# Altium footprint library Integrated_Circuit.PcbLib: 85 footprints (part 2 of 6)
Each footprint in its own frame and in the unit in brackets; x right, y up, seen from the top. Pads: shape width x height; smd on the part's side, far side on the other; paste and mask are expansions set on the pad; w line width, h text height; cw(c..) or ccw(c..) is an arc to the next point about the centre after c.
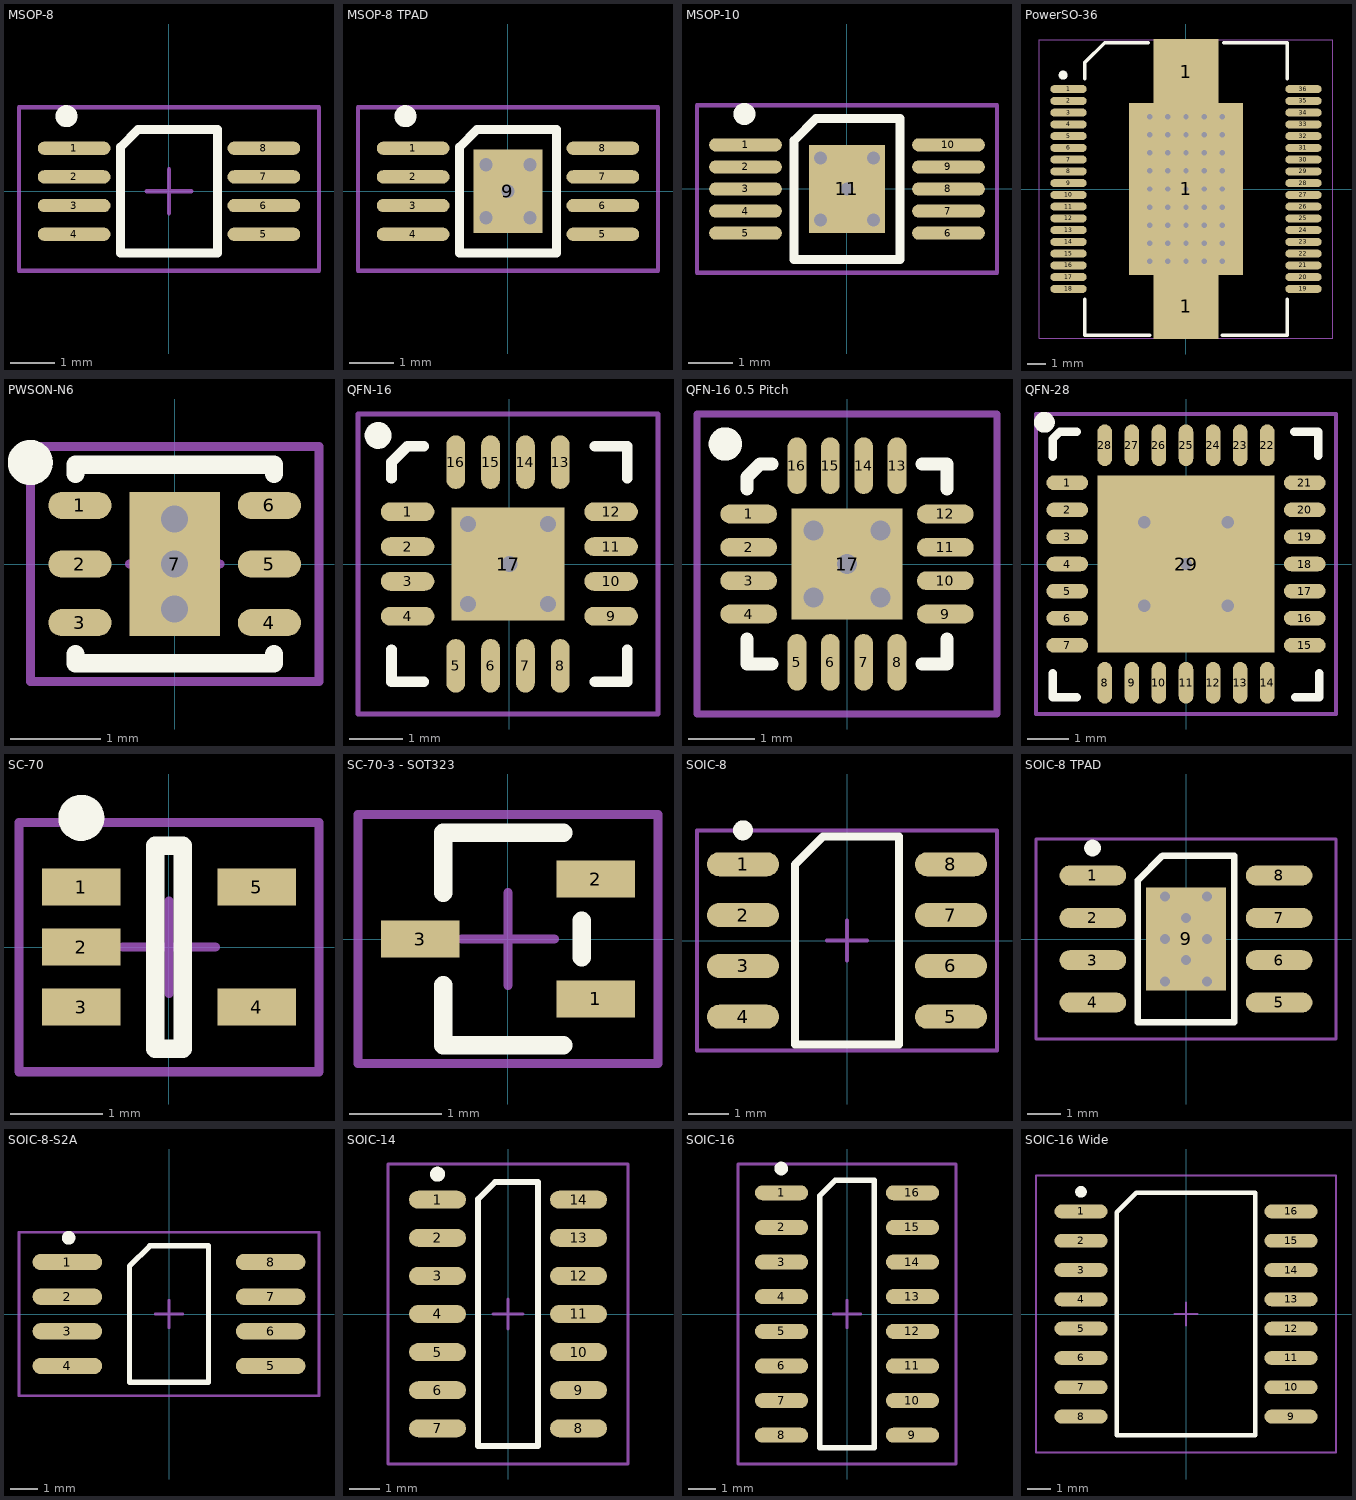
[diagram p1: the footprints below, top view; thin cyan lines are the x and y axes]

## MSOP-8 [mm] "without exposed pad"
height 1
pads (8):
  oval 1.65x0.3 smd: 1(-2.15,0.975) 2(-2.15,0.325) 3(-2.15,-0.325) 4(-2.15,-0.975) 5(2.15,-0.975) 6(2.15,-0.325) 7(2.15,0.325) 8(2.15,0.975)
Top Overlay:
  circle w0.25: c-2.325,1.7 r0.125
  lines w0.2: -1.1,-1.4 1.1,-1.4 1.1,1.4 -0.7,1.4 -1.1,1 -1.1,-1.4
Mechanical 15:
  lines w0.1: -0.5,0 0.5,0 ; 0,-0.5 0,0.5 ; -3.4,-1.8 -3.4,1.9 3.4,1.9 3.4,-1.8 -3.4,-1.8
3D body "User Library-MSOP-8-1.STEP": height 0.92, standoff 0, extent -2.5,-1.5 2.5,1.5

## MSOP-8 TPAD [mm] "with exposed pad"
height 1
pads (9):
  oval 1.65x0.3 smd: 1(-2.15,0.975) 2(-2.15,0.325) 3(-2.15,-0.325) 4(-2.15,-0.975) 5(2.15,-0.975) 6(2.15,-0.325) 7(2.15,0.325) 8(2.15,0.975)
  rect 1.57x1.89 smd: 9(0,0)
via 0,0 diameter 0.5 hole 0.3
via 0.5,0.6 diameter 0.5 hole 0.3
via -0.5,0.6 diameter 0.5 hole 0.3
via -0.5,-0.6 diameter 0.5 hole 0.3
via 0.5,-0.6 diameter 0.5 hole 0.3
Top Overlay:
  circle w0.25: c-2.325,1.7 r0.125
  lines w0.2: -1.1,-1.4 1.1,-1.4 1.1,1.4 -0.7,1.4 -1.1,1 -1.1,-1.4
Mechanical 15:
  lines w0.1: -0.5,0 0.5,0 ; 0,-0.5 0,0.5 ; -3.4,-1.8 -3.4,1.9 3.4,1.9 3.4,-1.8 -3.4,-1.8
3D body "User Library-MSOP-8-1.STEP": height 0.92, standoff 0, extent -2.5,-1.5 2.5,1.5

## MSOP-10 [mm]
height 1
pads (11):
  oval 1.65x0.3 smd: 1(-2.3,1) 2(-2.3,0.5) 3(-2.3,0) 4(-2.3,-0.5) 5(-2.3,-1) 6(2.3,-1) 7(2.3,-0.5) 8(2.3,0) 9(2.3,0.5) 10(2.3,1)
  rect 1.73x2 smd: 11(0,0)
via -0.6,0.7 diameter 0.5 hole 0.3
via -0.6,-0.7 diameter 0.5 hole 0.3
via 0.6,-0.7 diameter 0.5 hole 0.3
via 0.6,0.7 diameter 0.5 hole 0.3
via 0,0 diameter 0.5 hole 0.3
Top Overlay:
  circle w0.25: c-2.325,1.7 r0.125
  lines w0.2: -1.2,-1.6 1.2,-1.6 1.2,1.6 -0.7,1.6 -1.2,1.1 -1.2,-1.6
Mechanical 15:
  lines w0.1: -0.5,0 0.5,0 ; 0,-0.5 0,0.5 ; -3.4,-1.9 3.4,-1.9 3.4,1.9 -3.4,1.9 -3.4,-1.9
3D body "msop-10.STEP": height 1.15, standoff 0, extent -2.45,-1.5 2.45,1.5

## PowerSO-36 [mm]
pads (39):
  oval 2x0.45 smd: 1(-6.5,5.525) 2(-6.5,4.875) 3(-6.5,4.225) 4(-6.5,3.575) 5(-6.5,2.925) 6(-6.5,2.275) 7(-6.5,1.625) 8(-6.5,0.975) 9(-6.5,0.325) 10(-6.5,-0.325) 11(-6.5,-0.975) 12(-6.5,-1.625) 13(-6.5,-2.275) 14(-6.5,-2.925) 15(-6.5,-3.575) 16(-6.5,-4.225) 17(-6.5,-4.875) 18(-6.5,-5.525) 19(6.5,-5.525) 20(6.5,-4.875) 21(6.5,-4.225) 22(6.5,-3.575) 23(6.5,-2.925) 24(6.5,-2.275) 25(6.5,-1.625) 26(6.5,-0.975) 27(6.5,-0.325) 28(6.5,0.325) 29(6.5,0.975) 30(6.5,1.625) 31(6.5,2.275) 32(6.5,2.925) 33(6.5,3.575) 34(6.5,4.225) 35(6.5,4.875) 36(6.5,5.525)
  rect 3.6x3.6 smd: 1(0,-6.5) 1(0,6.5)
  rect 6.3x9.5 smd: 1(0,0)
via 0,0 diameter 0.5 hole 0.3
via 1,0 diameter 0.5 hole 0.3
via 2,0 diameter 0.5 hole 0.3
via -1,0 diameter 0.5 hole 0.3
via -2,0 diameter 0.5 hole 0.3
via -2,-1 diameter 0.5 hole 0.3
via -1,-1 diameter 0.5 hole 0.3
via 2,-1 diameter 0.5 hole 0.3
via 1,-1 diameter 0.5 hole 0.3
via 0,-1 diameter 0.5 hole 0.3
via -2,-2 diameter 0.5 hole 0.3
via -1,-2 diameter 0.5 hole 0.3
via 2,-2 diameter 0.5 hole 0.3
via 1,-2 diameter 0.5 hole 0.3
via 0,-2 diameter 0.5 hole 0.3
via -2,-3 diameter 0.5 hole 0.3
via -1,-3 diameter 0.5 hole 0.3
via 2,-3 diameter 0.5 hole 0.3
via 1,-3 diameter 0.5 hole 0.3
via 0,-3 diameter 0.5 hole 0.3
via -2,1 diameter 0.5 hole 0.3
via -1,1 diameter 0.5 hole 0.3
via 2,1 diameter 0.5 hole 0.3
via 1,1 diameter 0.5 hole 0.3
via 0,1 diameter 0.5 hole 0.3
via -2,2 diameter 0.5 hole 0.3
via -1,2 diameter 0.5 hole 0.3
via 2,2 diameter 0.5 hole 0.3
via 1,2 diameter 0.5 hole 0.3
via 0,2 diameter 0.5 hole 0.3
via -2,3 diameter 0.5 hole 0.3
via -1,3 diameter 0.5 hole 0.3
via 2,3 diameter 0.5 hole 0.3
via 1,3 diameter 0.5 hole 0.3
via 0,3 diameter 0.5 hole 0.3
via -2,4 diameter 0.5 hole 0.3
via -1,4 diameter 0.5 hole 0.3
via 2,4 diameter 0.5 hole 0.3
via 1,4 diameter 0.5 hole 0.3
via 0,4 diameter 0.5 hole 0.3
via -2,-4 diameter 0.5 hole 0.3
via -1,-4 diameter 0.5 hole 0.3
via 2,-4 diameter 0.5 hole 0.3
via 1,-4 diameter 0.5 hole 0.3
via 0,-4 diameter 0.5 hole 0.3
Top Overlay:
  circle w0.25: c-6.8,6.3 r0.125
  lines w0.2: -5.6,-6.1 -5.6,-8.1 -2,-8.1 ; -5.6,6.1 -5.6,7 -4.5,8.1 -2.1,8.1 ; 2,-8.1 5.6,-8.1 5.6,-6.1 ; 2.1,8.1 5.6,8.1 5.6,6.1
Mechanical 15:
  lines w0.05: -8.125,-8.25 8.125,-8.25 8.125,8.25 -8.125,8.25 -8.125,-8.25
  lines w0.1: -0.5,0 0.5,0 ; 0,-0.5 0,0.5
3D body "User Library-PowerSO36.STEP": height 3.6, standoff 0, extent -7.028,-8 7.028,8

## PWSON-N6 [mm]
pads (7):
  oval 0.7x0.3 smd: 1(-1.05,0.65) 2(-1.05,0) 3(-1.05,-0.65) 4(1.05,-0.65) 5(1.05,0) 6(1.05,0.65)
  rect 1x1.6 smd: 7(0,0)
via 0,0 diameter 0.5 hole 0.3
via 0,0.5 diameter 0.5 hole 0.3
via 0,-0.5 diameter 0.5 hole 0.3
Top Overlay:
  circle w0.25: c-1.6,1.125 r0.125
  lines w0.2: -1.1,-1 -1.1,-1.1 1.1,-1.1 1.1,-1 ; -1.1,1 -1.1,1.1 1.1,1.1 1.1,1
Mechanical 15:
  lines w0.1: -0.5,0 0.5,0 ; 0,-0.5 0,0.5 ; -1.6,-1.3 1.6,-1.3 1.6,1.3 -1.6,1.3 -1.6,-1.3
3D body "User Library-QFN6.step": height 0.75, standoff 0, extent -1.001,-1 1.001,1

## QFN-16 [mm] "QFN, 16 Pin, 0,65mm Pitch"
pads (17):
  oval 1x0.35 smd: 1(-1.9,0.975) 2(-1.9,0.325) 3(-1.9,-0.325) 4(-1.9,-0.975) 9(1.9,-0.975) 10(1.9,-0.325) 11(1.9,0.325) 12(1.9,0.975)
  oval 0.35x1 smd: 5(-1,-1.9) 6(-0.35,-1.9) 7(0.3,-1.9) 8(0.95,-1.9) 13(0.95,1.9) 14(0.3,1.9) 15(-0.35,1.9) 16(-1,1.9)
  rect 2.1x2.1 smd: 17(-0.025,0)
via -0.775,0.75 diameter 0.5 hole 0.3
via 0.725,0.75 diameter 0.5 hole 0.3
via 0.725,-0.75 diameter 0.5 hole 0.3
via -0.775,-0.75 diameter 0.5 hole 0.3
via 0,0 diameter 0.5 hole 0.3
Top Overlay:
  circle w0.25: c-2.45,2.4 r0.125
  lines w0.2: -2.2,-1.6 -2.2,-2.2 -1.6,-2.2 ; -2.2,1.6 -2.2,1.9 ; -1.6,2.2 -1.9,2.2 -2.2,1.9 ; 1.6,-2.2 2.2,-2.2 2.2,-1.6 ; 1.6,2.2 2.2,2.2 2.2,1.6 ; -2.2,1.9 -2.2,1.9
Mechanical 15:
  lines w0.1: -0.525,0 0.475,0 ; -0.025,-0.5 -0.025,0.5 ; -2.825,-2.8 2.775,-2.8 2.775,2.8 -2.825,2.8 -2.825,-2.8
3D body "QFN-16.STEP": height 0.85, standoff 0, extent -2.085,-2.085 2.085,2.085

## QFN-16 0.5 Pitch [mm] "QFN, 16 Pin, 0,5mm Pitch"
pads (17):
  oval 0.85x0.28 smd: 1(-1.475,0.75) 2(-1.475,0.25) 3(-1.475,-0.25) 4(-1.475,-0.75) 9(1.475,-0.75) 10(1.475,-0.25) 11(1.475,0.25) 12(1.475,0.75)
  oval 0.28x0.85 smd: 5(-0.75,-1.475) 6(-0.25,-1.475) 7(0.25,-1.475) 8(0.75,-1.475) 13(0.75,1.475) 14(0.25,1.475) 15(-0.25,1.475) 16(-0.75,1.475)
  rect 1.66x1.66 smd: 17(0,0)
via 0,0 diameter 0.5 hole 0.3
via -0.5,-0.5 diameter 0.5 hole 0.3
via 0.5,-0.5 diameter 0.5 hole 0.3
via 0.5,0.5 diameter 0.5 hole 0.3
via -0.5,0.5 diameter 0.5 hole 0.3
Top Overlay:
  circle w0.25: c-1.825,1.8 r0.125
  lines w0.2: -1.501,-1.125 -1.501,-1.501 -1.125,-1.501 ; -1.501,1.125 -1.501,1.3 ; -1.125,1.501 -1.3,1.501 -1.501,1.3 ; 1.125,-1.501 1.501,-1.501 1.501,-1.125 ; 1.125,1.501 1.501,1.501 1.501,1.125 ; -1.501,1.3 -1.501,1.3
Mechanical 15:
  lines w0.1: -0.5,0 0.5,0 ; 0,-0.5 0,0.5 ; -2.25,-2.25 -2.25,2.25 2.25,2.25 2.25,-2.25 -2.25,-2.25
3D body "User Library-QFN-16.STEP": height 0.9, standoff 0, extent -1.501,-1.501 1.501,1.501

## QFN-28 [mm] "QFN, 28 Pin, 0,65mm Pitch"
pads (29):
  oval 1x0.35 smd: 1(-2.85,1.95) 2(-2.85,1.3) 3(-2.85,0.65) 4(-2.85,0) 5(-2.85,-0.65) 6(-2.85,-1.3) 7(-2.85,-1.95) 15(2.85,-1.95) 16(2.85,-1.3) 17(2.85,-0.65) 18(2.85,0) 19(2.85,0.65) 20(2.85,1.3) 21(2.85,1.95)
  oval 0.35x1 smd: 8(-1.95,-2.85) 9(-1.3,-2.85) 10(-0.65,-2.85) 11(0,-2.85) 12(0.65,-2.85) 13(1.3,-2.85) 14(1.95,-2.85) 22(1.95,2.85) 23(1.3,2.85) 24(0.65,2.85) 25(0,2.85) 26(-0.65,2.85) 27(-1.3,2.85) 28(-1.95,2.85)
  rect 4.25x4.25 smd: 29(0,0)
via 0,0 diameter 0.5 hole 0.3
via 1,-1 diameter 0.5 hole 0.3
via -1,-1 diameter 0.5 hole 0.3
via 1,1 diameter 0.5 hole 0.3
via -1,1 diameter 0.5 hole 0.3
Top Overlay:
  circle w0.25: c-3.4,3.4 r0.125
  lines w0.2: -3.2,-2.625 -3.2,-3.2 -2.625,-3.2 ; -3.2,2.575 -3.2,3 -3.025,3.175 -2.625,3.175 ; 2.6,3.175 3.175,3.175 3.175,2.6 ; 2.625,-3.2 3.2,-3.2 3.2,-2.625
Mechanical 15:
  lines w0.1: -0.5,0 0.5,0 ; 0,-0.5 0,0.5 ; -3.6,-3.6 3.6,-3.6 3.6,3.6 -3.6,3.6 -3.6,-3.6
3D body "User Library-QFN-28.STEP": height 1.02, standoff -0.08, extent -3,-3 3,3

## SC-70 [mm]
pads (5):
  rect 0.85x0.4 smd: 1(-0.95,0.65) 2(-0.95,0) 3(-0.95,-0.65) 4(0.95,-0.65) 5(0.95,0.65)
Top Overlay:
  circle w0.25: c-0.95,1.4 r0.125
  lines w0.2: -0.15,-1.1 -0.15,1.1 0.15,1.1 0.15,-1.1 -0.15,-1.1
Mechanical 15:
  lines w0.1: -0.5,0 0.5,0 ; 0,-0.5 0,0.5 ; -1.625,-1.35 1.625,-1.35 1.625,1.35 -1.625,1.35 -1.625,-1.35
3D body "SC-70.stp": height 0.96, standoff 0.01, extent -1.14,-1 1.14,1

## SC-70-3 - SOT323 [mm]
pads (3):
  rect 0.85x0.4 smd: 1(0.95,-0.65) 2(0.95,0.65) 3(-0.95,0)
Top Overlay:
  lines w0.2: -0.7,-0.5 -0.7,-1.15 0.6,-1.15 ; -0.7,0.5 -0.7,1.15 0.6,1.15 ; 0.8,-0.2 0.8,0.2
Mechanical 15:
  lines w0.1: -0.5,0 0.5,0 ; 0,-0.5 0,0.5 ; -1.625,-1.35 1.625,-1.35 1.625,1.35 -1.625,1.35 -1.625,-1.35
3D body "User Library-sc70-3.step": height 1, standoff 0, extent -1.15,-1.05 1.15,1.05

## SOIC-8 [mm] "SOIC, 8 Pin, Pitch 1,27mm"
height 2.59
pads (8):
  oval 1.8x0.6 smd: 1(-2.6,1.905) 2(-2.6,0.635) 3(-2.6,-0.635) 4(-2.6,-1.905) 5(2.6,-1.905) 6(2.6,-0.635) 7(2.6,0.635) 8(2.6,1.905)
Top Overlay:
  circle w0.25: c-2.6,2.755 r0.125
  lines w0.2: -1.3,-2.6 1.3,-2.6 1.3,2.6 -0.6,2.6 -1.3,1.9 -1.3,-2.6
Mechanical 15:
  lines w0.1: -0.5,0 0.5,0 ; 0,-0.5 0,0.5 ; -3.75,-2.75 -3.75,2.75 3.75,2.75 3.75,-2.75 -3.75,-2.75
3D body "MIC2026-1BM - SOIC-8.stp": height 1.7, standoff 0, extent -3,-2.45 3,2.45

## SOIC-8 TPAD [mm]
pads (9):
  oval 2x0.6 smd: 1(-2.794,1.905) 2(-2.794,0.635) 3(-2.794,-0.635) 4(-2.794,-1.905) 5(2.794,-1.905) 6(2.794,-0.635) 7(2.794,0.635) 8(2.794,1.905)
  rect 2.413x3.099 smd: 9(0,0)
via 0,0.635 diameter 0.5 hole 0.3
via 0,-0.635 diameter 0.5 hole 0.3
via 0.635,0 diameter 0.5 hole 0.3
via -0.635,0 diameter 0.5 hole 0.3
via -0.635,1.27 diameter 0.5 hole 0.3
via 0.635,1.27 diameter 0.5 hole 0.3
via 0.635,-1.27 diameter 0.5 hole 0.3
via -0.635,-1.27 diameter 0.5 hole 0.3
Top Overlay:
  circle w0.25: c-2.805,2.73 r0.125
  lines w0.2: -1.448,-2.5 -1.448,1.753 -0.7,2.5 1.448,2.5 1.448,-2.5 -1.448,-2.5
Mechanical 15:
  lines w0.1: -0.5,0 0.5,0 ; 0,-0.5 0,0.5 ; -4.5,-3 4.5,-3 4.5,3 -4.5,3 -4.5,-3
3D body "MIC2026-1BM - SOIC-8.stp": height 1.7, standoff 0, extent -3,-2.45 3,2.45

## SOIC-8-S2A [mm] "SOIC, 8-Leads, Body 5.3x7.5mm, Pitch 1.27mm, IPC Medium Density"
height 2.65
pads (8):
  oval 2.55x0.6 smd: 1(-3.725,1.905) 2(-3.725,0.635) 3(-3.725,-0.635) 4(-3.725,-1.905) 5(3.725,-1.905) 6(3.725,-0.635) 7(3.725,0.635) 8(3.725,1.905)
Top Overlay:
  circle w0.25: c-3.681,2.794 r0.125
  lines w0.2: -1.448,-2.5 -1.448,1.753 -0.7,2.5 1.448,2.5 1.448,-2.5 -1.448,-2.5
Mechanical 15:
  lines w0.1: -0.5,0 0.5,0 ; 0,-0.5 0,0.5 ; -5.5,-3 -5.5,3 5.5,3 5.5,-3 -5.5,-3
3D body "WSOIC-8.step": height 1.7, standoff 0, extent -4.064,-2.413 4.115,2.413

## SOIC-14 [mm]
pads (14):
  oval 1.9x0.6 smd: 1(-2.35,3.81) 2(-2.35,2.54) 3(-2.35,1.27) 4(-2.35,0) 5(-2.35,-1.27) 6(-2.35,-2.54) 7(-2.35,-3.81) 8(2.35,-3.81) 9(2.35,-2.54) 10(2.35,-1.27) 11(2.35,0) 12(2.35,1.27) 13(2.35,2.54) 14(2.35,3.81)
Top Overlay:
  circle w0.25: c-2.35,4.66 r0.125
  lines w0.2: -1,-4.4 -1,3.826 -0.426,4.4 1,4.4 1,-4.4 -1,-4.4
Mechanical 15:
  lines w0.1: -0.5,0 0.5,0 ; 0,-0.5 0,0.5 ; -4,-5 4,-5 4,5 -4,5 -4,-5
3D body "SOIC-14.stp": height 1.75, standoff 0, extent -2.9,-4.23 2.9,4.3

## SOIC-16 [mm]
pads (16):
  oval 1.95x0.55 smd: 1(-2.4,4.445) 2(-2.4,3.175) 3(-2.4,1.905) 4(-2.4,0.635) 5(-2.4,-0.635) 6(-2.4,-1.905) 7(-2.4,-3.175) 8(-2.4,-4.445) 9(2.4,-4.445) 10(2.4,-3.175) 11(2.4,-1.905) 12(2.4,-0.635) 13(2.4,0.635) 14(2.4,1.905) 15(2.4,3.175) 16(2.4,4.445)
Top Overlay:
  circle w0.25: c-2.411,5.334 r0.125
  lines w0.2: -1,-4.9 1,-4.9 1,4.9 -0.434,4.9 -1,4.334 -1,-4.9
Mechanical 15:
  lines w0.1: -0.5,0 0.5,0 ; 0,-0.5 0,0.5 ; -4,-5.5 -4,5.5 4,5.5 4,-5.5 -4,-5.5
3D body "SOIC-16.stp": height 1.65, standoff 0, extent -3.04,-5 3.04,5

## SOIC-16 Wide [mm] "SOIC, 16-Leads, Body 10.3x7.5mm, Pitch 1.27mm, IPC Medium Density"
height 2.65
pads (16):
  oval 2.3x0.6 smd: 1(-4.55,4.445) 2(-4.55,3.175) 3(-4.55,1.905) 4(-4.55,0.635) 5(-4.55,-0.635) 6(-4.55,-1.905) 7(-4.55,-3.175) 8(-4.55,-4.445) 9(4.55,-4.445) 10(4.55,-3.175) 11(4.55,-1.905) 12(4.55,-0.635) 13(4.55,0.635) 14(4.55,1.905) 15(4.55,3.175) 16(4.55,4.445)
Top Overlay:
  circle w0.25: c-4.55,5.295 r0.125
  lines w0.2: -3,-5.25 -3,4.406 -2.156,5.25 3,5.25 3,-5.25 -3,-5.25
Mechanical 15:
  lines w0.1: -0.5,0 0.5,0 ; 0,-0.5 0,0.5 ; -6.5,-6 -6.5,6 6.5,6 6.5,-6 -6.5,-6
3D body "SOIC16 Wide.STEP": height 3.5, standoff 0, extent -5.15,-5.1 5.15,5.1